# Altium footprint library Apalis Evaluation Board.PcbLib: 212 footprints (part 11 of 14)
Each footprint in its own frame and in the unit in brackets; x right, y up, seen from the top. Pads: shape width x height; smd on the part's side, far side on the other; paste and mask are expansions set on the pad; w line width, h text height; cw(c..) or ccw(c..) is an arc to the next point about the centre after c.
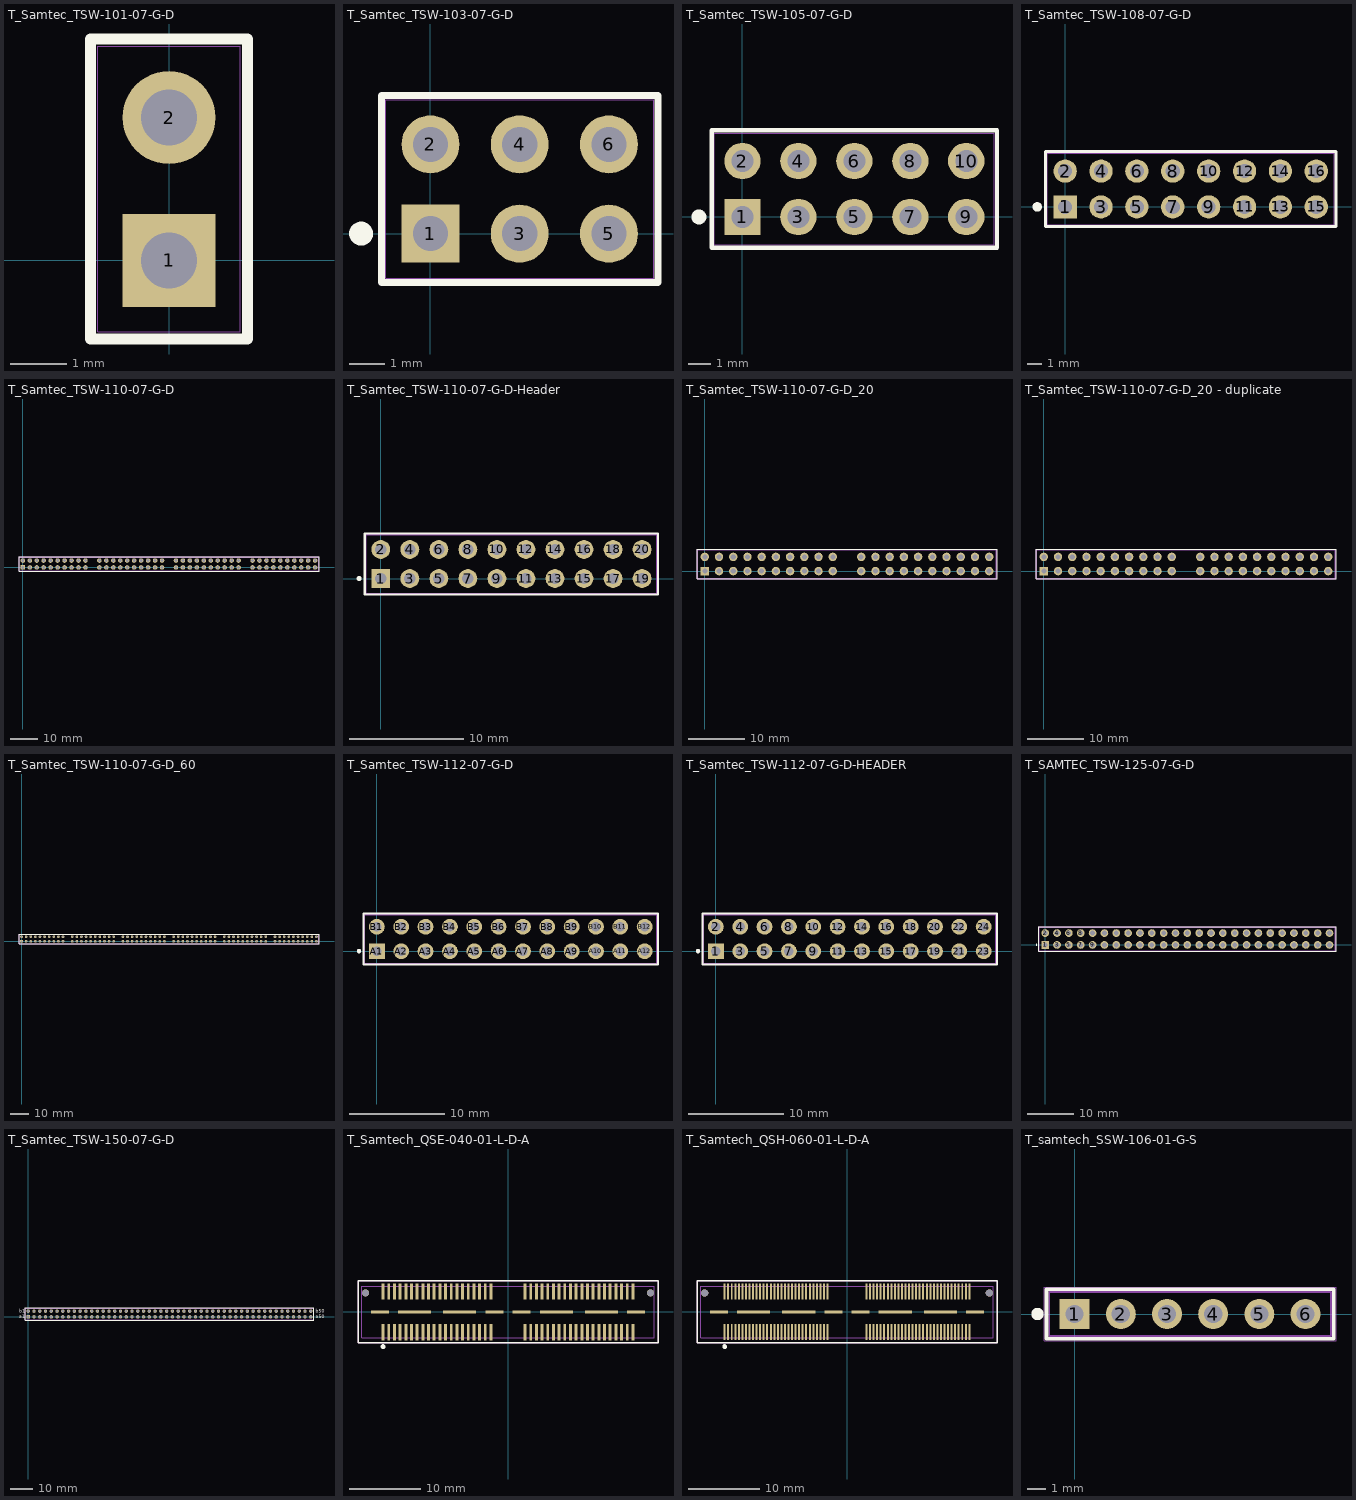
[diagram p10: the footprints below, top view; thin cyan lines are the x and y axes]

## T_Samtec_TSW-101-07-G-D [mm] "Header, 1x2 Pins, 2.54 mm pitch, male"
height 8.51
pads (2):
  rect 1.65x1.65 hole 1: 1(0,0)
  round 1.65 hole 1: 2(0,2.54)
Top Overlay:
  lines w0.2: -1.395,-1.395 -1.395,3.935 1.395,3.935 1.395,-1.395 -1.395,-1.395
Mechanical 1:
  lines w0.05: -1.37,-1.37 1.37,-1.37 1.37,3.91 -1.37,3.91 -1.37,-1.37
Mechanical 2:
  lines w0.001: -1.27,-1.27 -1.27,3.81 1.27,3.81 1.27,-1.27 -1.27,-1.27
Mechanical 3:
  lines w0.1: -1.37,-1.37 1.37,-1.37 1.37,3.91 -1.37,3.91 -1.37,-1.37
3D body "Samtec-TSW-101-07-G-D.step": height 8.4, standoff -2.52, extent -1.27,-1.27 1.27,3.81

## T_Samtec_TSW-103-07-G-D [mm] "Header, 2x3 Pins, 2.54 mm pitch, male"
height 8.51
pads (6):
  rect 1.65x1.65 hole 1: 1(0,0)
  round 1.65 hole 1: 2(0,2.54) 3(2.54,0) 4(2.54,2.54) 5(5.08,0) 6(5.08,2.54)
Top Overlay:
  circle w0.5: c-1.975,0 r0.088
  lines w0.2: -1.395,-1.395 6.475,-1.395 6.475,3.935 -1.395,3.935 -1.395,-1.395
Mechanical 1:
  lines w0.05: -1.37,-1.37 -1.37,3.91 6.45,3.91 6.45,-1.37 -1.37,-1.37
Mechanical 2:
  lines w0.001: -1.27,-1.27 -1.27,3.81 6.35,3.81 6.35,-1.27 -1.27,-1.27
Mechanical 3:
  lines w0.1: -1.37,-1.37 6.45,-1.37 6.45,3.91 -1.37,3.91 -1.37,-1.37
3D body "Samtec-TSW-103-07-G-D.step": height 8.4, standoff -2.52, extent -1.27,-1.27 6.35,3.81

## T_Samtec_TSW-105-07-G-D [mm] "Header, 2x5 Pins, 2.54 mm pitch, male"
height 8.51
pads (10):
  rect 1.65x1.65 hole 1: 1(0,0)
  round 1.65 hole 1: 2(0,2.54) 3(2.54,0) 4(2.54,2.54) 5(5.08,0) 6(5.08,2.54) 7(7.62,0) 8(7.62,2.54) 9(10.16,0) 10(10.16,2.54)
Top Overlay:
  circle w0.5: c-1.975,0 r0.088
  lines w0.2: 11.55,-1.395 -1.395,-1.395 -1.395,3.935 11.55,3.935 ; 11.555,-1.395 11.555,3.935
Mechanical 1:
  lines w0.05: -1.37,-1.37 -1.37,3.91 11.53,3.91 11.53,-1.37 -1.37,-1.37
Mechanical 2:
  lines w0.001: -1.27,-1.27 11.43,-1.27 11.43,3.81 -1.27,3.81 -1.27,-1.27
Mechanical 3:
  lines w0.1: -1.37,-1.37 11.53,-1.37 11.53,3.91 -1.37,3.91 -1.37,-1.37
3D body "Samtec-TSW-105-07-G-D.step": height 8.4, standoff -2.52, extent -1.27,-1.27 11.43,3.81

## T_Samtec_TSW-108-07-G-D [mm] "Header, 2x8 Pins, 2.54 mm pitch, male"
height 8.51
pads (16):
  rect 1.65x1.65 hole 1: 1(0,0)
  round 1.65 hole 1: 2(0,2.54) 3(2.54,0) 4(2.54,2.54) 5(5.08,0) 6(5.08,2.54) 7(7.62,0) 8(7.62,2.54) 9(10.16,0) 10(10.16,2.54) 11(12.7,0) 12(12.7,2.54) 13(15.24,0) 14(15.24,2.54) 15(17.78,0) 16(17.78,2.54)
Top Overlay:
  circle w0.5: c-1.975,0 r0.088
  lines w0.2: -1.395,-1.395 -1.395,3.935 19.175,3.935 19.175,-1.395 -1.395,-1.395
Mechanical 1:
  lines w0.05: -1.37,-1.37 19.15,-1.37 19.15,3.91 -1.37,3.91 -1.37,-1.37
Mechanical 2:
  lines w0.001: -1.27,-1.27 -1.27,3.81 19.05,3.81 19.05,-1.27 -1.27,-1.27
Mechanical 3:
  lines w0.1: -1.37,-1.37 -1.37,3.91 19.15,3.91 19.15,-1.37 -1.37,-1.37
3D body "Samtec-TSW-108-07-G-D.step": height 8.4, standoff -2.52, extent -1.27,-1.27 19.05,3.81

## T_Samtec_TSW-110-07-G-D [mm] "Header 2x50 pin 2.54mm pitch"
height 10.8
pads (80):
  rect 1.65x1.65 hole 1: A1(0,0)
  round 1.65 hole 1: A2(2.54,0) A3(5.08,0) A4(7.62,0) A5(10.16,0) A6(12.7,0) A7(15.24,0) A8(17.78,0) A9(20.32,0) A10(22.86,0) A11(27.94,0) A12(30.48,0) A13(33.02,0) A14(35.56,0) A15(38.1,0) A16(40.64,0) A17(43.18,0) A18(45.72,0) A19(48.26,0) A20(50.8,0) A21(55.88,0) A22(58.42,0) A23(60.96,0) A24(63.5,0) A25(66.04,0) A26(68.58,0) A27(71.12,0) A28(73.66,0) A29(76.2,0) A30(78.74,0) A31(83.82,0) A32(86.36,0) A33(88.9,0) A34(91.44,0) A35(93.98,0) A36(96.52,0) A37(99.06,0) A38(101.6,0) A39(104.14,0) A40(106.68,0) B1(0,2.54) B2(2.54,2.54) B3(5.08,2.54) B4(7.62,2.54) B5(10.16,2.54) B6(12.7,2.54) B7(15.24,2.54) B8(17.78,2.54) B9(20.32,2.54) B10(22.86,2.54) B11(27.94,2.54) B12(30.48,2.54) B13(33.02,2.54) B14(35.56,2.54) B15(38.1,2.54) B16(40.64,2.54) B17(43.18,2.54) B18(45.72,2.54) B19(48.26,2.54) B20(50.8,2.54) B21(55.88,2.54) B22(58.42,2.54) B23(60.96,2.54) B24(63.5,2.54) B25(66.04,2.54) B26(68.58,2.54) B27(71.12,2.54) B28(73.66,2.54) B29(76.2,2.54) B30(78.74,2.54) B31(83.82,2.54) B32(86.36,2.54) B33(88.9,2.54) B34(91.44,2.54) B35(93.98,2.54) B36(96.52,2.54) B37(99.06,2.54) B38(101.6,2.54) B39(104.14,2.54) B40(106.68,2.54)
Top Overlay:
  lines w0.2: -1.395,-1.395 -1.395,3.935 108.075,3.935 108.075,-1.395 -1.395,-1.395
Mechanical 1:
  lines w0.05: -1.37,-1.37 -1.37,3.91 108.05,3.91 108.05,-1.37 -1.37,-1.37
Mechanical 2:
  lines w0.001: 107.95,-1.27 107.95,3.81 ; 107.95,-1.27 107.95,3.81 ; 107.95,-1.27 -1.27,-1.27 -1.27,3.81 107.95,3.81
Mechanical 3:
  lines w0.1: -1.37,-1.37 108.05,-1.37 108.05,3.91 -1.37,3.91 -1.37,-1.37
3D body "Samtec-TSW-110-07-G-D.step": height 8.4, standoff -2.52, extent 82.55,-1.27 107.95,3.81
3D body "Samtec-TSW-110-07-G-D.step": height 8.4, standoff -2.52, extent 54.61,-1.27 80.01,3.81
3D body "Samtec-TSW-110-07-G-D.step": height 8.4, standoff -2.52, extent 26.67,-1.27 52.07,3.81
3D body "Samtec-TSW-110-07-G-D.step": height 8.4, standoff -2.52, extent -1.27,-1.27 24.13,3.81

## T_Samtec_TSW-110-07-G-D-Header [mm] "Header, 2x10 Pins, 2.54 mm pitch"
height 8.51
pads (20):
  rect 1.65x1.65 hole 1: 1(0,0)
  round 1.65 hole 1: 2(0,2.54) 3(2.54,0) 4(2.54,2.54) 5(5.08,0) 6(5.08,2.54) 7(7.62,0) 8(7.62,2.54) 9(10.16,0) 10(10.16,2.54) 11(12.7,0) 12(12.7,2.54) 13(15.24,0) 14(15.24,2.54) 15(17.78,0) 16(17.78,2.54) 17(20.32,0) 18(20.32,2.54) 19(22.86,0) 20(22.86,2.54)
Top Overlay:
  circle w0.25: c-1.896,0 r0.1
  lines w0.2: -1.395,-1.395 -1.395,3.935 24.255,3.935 24.255,-1.349 24.209,-1.395 -1.395,-1.395
Mechanical 1:
  lines w0.05: -1.37,-1.374 24.23,-1.374 24.23,3.916 -1.37,3.916 -1.37,-1.374
Mechanical 2:
  lines w0.001: -1.27,-1.27 24.13,-1.27 24.13,3.81 -1.27,3.81 -1.27,-1.27
Mechanical 3:
  lines w0.1: -1.37,-1.37 24.23,-1.37 24.23,3.91 -1.37,3.91 -1.37,-1.37
3D body "Samtec-TSW-110-07-G-D.step": height 8.4, standoff -2.52, extent -1.27,-1.27 24.13,3.81

## T_Samtec_TSW-110-07-G-D_20 [mm] "Header 2x20 pin 2.54mm pitch"
height 10.8
pads (40):
  rect 1.5x1.5 hole 0.9: A1(0,0)
  round 1.5 hole 0.9: A2(2.54,0) A3(5.08,0) A4(7.62,0) A5(10.16,0) A6(12.7,0) A7(15.24,0) A8(17.78,0) A9(20.32,0) A10(22.86,0) A11(27.94,0) A12(30.48,0) A13(33.02,0) A14(35.56,0) A15(38.1,0) A16(40.64,0) A17(43.18,0) A18(45.72,0) A19(48.26,0) A20(50.8,0) B1(0,2.54) B2(2.54,2.54) B3(5.08,2.54) B4(7.62,2.54) B5(10.16,2.54) B6(12.7,2.54) B7(15.24,2.54) B8(17.78,2.54) B9(20.32,2.54) B10(22.86,2.54) B11(27.94,2.54) B12(30.48,2.54) B13(33.02,2.54) B14(35.56,2.54) B15(38.1,2.54) B16(40.64,2.54) B17(43.18,2.54) B18(45.72,2.54) B19(48.26,2.54) B20(50.8,2.54)
Top Overlay:
  lines w0.2: -1.395,-1.395 -1.395,3.935 52.195,3.935 52.195,-1.395 -1.395,-1.395
Mechanical 1:
  lines w0.05: -1.37,-1.37 -1.37,3.91 52.17,3.91 52.17,-1.37 -1.37,-1.37
Mechanical 2:
  lines w0.001: 52.07,-1.27 -1.27,-1.27 -1.27,3.81 52.07,3.81 ; 52.07,-1.27 52.07,3.81 ; 52.07,-1.27 52.07,3.81
Mechanical 3:
  lines w0.1: -1.37,-1.37 52.17,-1.37 52.17,3.91 -1.37,3.91 -1.37,-1.37
3D body "Samtec-TSW-110-07-G-D.step": height 8.4, standoff -2.52, extent 26.67,-1.27 52.07,3.81
3D body "Samtec-TSW-110-07-G-D.step": height 8.4, standoff -2.52, extent -1.27,-1.27 24.13,3.81

## T_Samtec_TSW-110-07-G-D_20 - duplicate [mm] "Header 2x20 pin 2.54mm pitch"
height 10.8
pads (40):
  rect 1.5x1.5 hole 0.9: A1(0,0)
  round 1.5 hole 0.9: A2(2.54,0) A3(5.08,0) A4(7.62,0) A5(10.16,0) A6(12.7,0) A7(15.24,0) A8(17.78,0) A9(20.32,0) A10(22.86,0) A11(27.94,0) A12(30.48,0) A13(33.02,0) A14(35.56,0) A15(38.1,0) A16(40.64,0) A17(43.18,0) A18(45.72,0) A19(48.26,0) A20(50.8,0) B1(0,2.54) B2(2.54,2.54) B3(5.08,2.54) B4(7.62,2.54) B5(10.16,2.54) B6(12.7,2.54) B7(15.24,2.54) B8(17.78,2.54) B9(20.32,2.54) B10(22.86,2.54) B11(27.94,2.54) B12(30.48,2.54) B13(33.02,2.54) B14(35.56,2.54) B15(38.1,2.54) B16(40.64,2.54) B17(43.18,2.54) B18(45.72,2.54) B19(48.26,2.54) B20(50.8,2.54)
Top Overlay:
  lines w0.2: -1.395,-1.395 52.195,-1.395 52.195,3.935 -1.395,3.935 -1.395,-1.395
Mechanical 1:
  lines w0.05: -1.37,-1.37 52.17,-1.37 52.17,3.91 -1.37,3.91 -1.37,-1.37
Mechanical 2:
  lines w0.001: 52.07,-1.27 52.07,3.81 ; 52.07,-1.27 52.07,3.81 ; 52.07,-1.27 -1.27,-1.27 -1.27,3.81 52.07,3.81
Mechanical 3:
  lines w0.1: -1.37,-1.37 -1.37,3.91 52.17,3.91 52.17,-1.37 -1.37,-1.37
3D body "Samtec-TSW-110-07-G-D.step": height 8.4, standoff -2.52, extent -1.27,-1.27 24.13,3.81
3D body "Samtec-TSW-110-07-G-D.step": height 8.4, standoff -2.52, extent 26.67,-1.27 52.07,3.81

## T_Samtec_TSW-110-07-G-D_60 [mm] "Header 2x60 pin 2.54mm pitch"
height 10.8
pads (120):
  rect 1.5x1.5 hole 0.9: A1(0,0)
  round 1.5 hole 0.9: A2(2.54,0) A3(5.08,0) A4(7.62,0) A5(10.16,0) A6(12.7,0) A7(15.24,0) A8(17.78,0) A9(20.32,0) A10(22.86,0) A11(27.94,0) A12(30.48,0) A13(33.02,0) A14(35.56,0) A15(38.1,0) A16(40.64,0) A17(43.18,0) A18(45.72,0) A19(48.26,0) A20(50.8,0) A21(55.88,0) A22(58.42,0) A23(60.96,0) A24(63.5,0) A25(66.04,0) A26(68.58,0) A27(71.12,0) A28(73.66,0) A29(76.2,0) A30(78.74,0) A31(83.82,0) A32(86.36,0) A33(88.9,0) A34(91.44,0) A35(93.98,0) A36(96.52,0) A37(99.06,0) A38(101.6,0) A39(104.14,0) A40(106.68,0) A41(111.76,0) A42(114.3,0) A43(116.84,0) A44(119.38,0) A45(121.92,0) A46(124.46,0) A47(127,0) A48(129.54,0) A49(132.08,0) A50(134.62,0) A51(139.7,0) A52(142.24,0) A53(144.78,0) A54(147.32,0) A55(149.86,0) A56(152.4,0) A57(154.94,0) A58(157.48,0) A59(160.02,0) A60(162.56,0) B1(0,2.54) B2(2.54,2.54) B3(5.08,2.54) B4(7.62,2.54) B5(10.16,2.54) B6(12.7,2.54) B7(15.24,2.54) B8(17.78,2.54) B9(20.32,2.54) B10(22.86,2.54) B11(27.94,2.54) B12(30.48,2.54) B13(33.02,2.54) B14(35.56,2.54) B15(38.1,2.54) B16(40.64,2.54) B17(43.18,2.54) B18(45.72,2.54) B19(48.26,2.54) B20(50.8,2.54) B21(55.88,2.54) B22(58.42,2.54) B23(60.96,2.54) B24(63.5,2.54) B25(66.04,2.54) B26(68.58,2.54) B27(71.12,2.54) B28(73.66,2.54) B29(76.2,2.54) B30(78.74,2.54) B31(83.82,2.54) B32(86.36,2.54) B33(88.9,2.54) B34(91.44,2.54) B35(93.98,2.54) B36(96.52,2.54) B37(99.06,2.54) B38(101.6,2.54) B39(104.14,2.54) B40(106.68,2.54) B41(111.76,2.54) B42(114.3,2.54) B43(116.84,2.54) B44(119.38,2.54) B45(121.92,2.54) B46(124.46,2.54) B47(127,2.54) B48(129.54,2.54) B49(132.08,2.54) B50(134.62,2.54) B51(139.7,2.54) B52(142.24,2.54) B53(144.78,2.54) B54(147.32,2.54) B55(149.86,2.54) B56(152.4,2.54) B57(154.94,2.54) B58(157.48,2.54) B59(160.02,2.54) B60(162.56,2.54)
Top Overlay:
  lines w0.2: -1.395,-1.395 163.955,-1.395 163.955,3.935 -1.395,3.935 -1.395,-1.395
Mechanical 1:
  lines w0.05: -1.37,-1.37 163.93,-1.37 163.93,3.91 -1.37,3.91 -1.37,-1.37
Mechanical 2:
  lines w0.001: 163.83,-1.27 -1.27,-1.27 -1.27,3.81 163.83,3.81 ; 163.83,-1.27 163.83,3.81 ; 163.83,-1.27 163.83,3.81
Mechanical 3:
  lines w0.1: -1.37,-1.37 163.93,-1.37 163.93,3.91 -1.37,3.91 -1.37,-1.37
3D body "Samtec-TSW-110-07-G-D.step": height 8.4, standoff -2.52, extent -1.27,-1.27 24.13,3.81
3D body "Samtec-TSW-110-07-G-D.step": height 8.4, standoff -2.52, extent 26.67,-1.27 52.07,3.81
3D body "Samtec-TSW-110-07-G-D.step": height 8.4, standoff -2.52, extent 54.61,-1.27 80.01,3.81
3D body "Samtec-TSW-110-07-G-D.step": height 8.4, standoff -2.52, extent 82.55,-1.27 107.95,3.81
3D body "Samtec-TSW-110-07-G-D.step": height 8.4, standoff -2.52, extent 110.49,-1.27 135.89,3.81
3D body "Samtec-TSW-110-07-G-D.step": height 8.4, standoff -2.52, extent 138.43,-1.27 163.83,3.81

## T_Samtec_TSW-112-07-G-D [mm] "Header, 2x12 Pins, 2.54 mm pitch, male"
height 8.51
pads (24):
  rect 1.65x1.65 hole 1: A1(0,0)
  round 1.65 hole 1: A2(2.54,0) A3(5.08,0) A4(7.62,0) A5(10.16,0) A6(12.7,0) A7(15.24,0) A8(17.78,0) A9(20.32,0) A10(22.86,0) A11(25.4,0) A12(27.94,0) B1(0,2.54) B2(2.54,2.54) B3(5.08,2.54) B4(7.62,2.54) B5(10.16,2.54) B6(12.7,2.54) B7(15.24,2.54) B8(17.78,2.54) B9(20.32,2.54) B10(22.86,2.54) B11(25.4,2.54) B12(27.94,2.54)
Top Overlay:
  circle w0.25: c-1.871,0 r0.1
  lines w0.2: -1.395,-1.395 -1.395,3.935 29.335,3.935 29.335,-1.395 -1.395,-1.395
Mechanical 1:
  lines w0.05: -1.37,-1.373 -1.37,3.91 29.31,3.91 29.31,-1.373 -1.37,-1.373
Mechanical 2:
  lines w0.001: -1.27,-1.27 -1.27,3.81 29.21,3.81 29.21,-1.27 -1.27,-1.27
Mechanical 3:
  lines w0.1: -1.37,-1.37 -1.37,3.91 29.31,3.91 29.31,-1.37 -1.37,-1.37
3D body "Samtec-TSW-112-07-G-D.step": height 8.4, standoff -2.52, extent -1.27,-1.27 29.21,3.81

## T_Samtec_TSW-112-07-G-D-HEADER [mm] "Header, 2x12 Pins, 2.54 mm pitch, male"
height 8.51
pads (24):
  rect 1.65x1.65 hole 1: 1(0,0)
  round 1.65 hole 1: 2(0,2.54) 3(2.54,0) 4(2.54,2.54) 5(5.08,0) 6(5.08,2.54) 7(7.62,0) 8(7.62,2.54) 9(10.16,0) 10(10.16,2.54) 11(12.7,0) 12(12.7,2.54) 13(15.24,0) 14(15.24,2.54) 15(17.78,0) 16(17.78,2.54) 17(20.32,0) 18(20.32,2.54) 19(22.86,0) 20(22.86,2.54) 21(25.4,0) 22(25.4,2.54) 23(27.94,0) 24(27.94,2.54)
Top Overlay:
  circle w0.25: c-1.871,0 r0.1
  lines w0.2: -1.395,-1.395 -1.395,3.935 29.335,3.935 29.335,-1.395 -1.395,-1.395
Mechanical 1:
  lines w0.05: -1.37,-1.373 -1.37,3.91 29.31,3.91 29.31,-1.373 -1.37,-1.373
Mechanical 2:
  lines w0.001: -1.27,-1.27 -1.27,3.81 29.21,3.81 29.21,-1.27 -1.27,-1.27
Mechanical 3:
  lines w0.1: -1.37,-1.37 -1.37,3.91 29.31,3.91 29.31,-1.37 -1.37,-1.37
3D body "Samtec-TSW-112-07-G-D.step": height 8.4, standoff -2.52, extent -1.27,-1.27 29.21,3.81

## T_SAMTEC_TSW-125-07-G-D [mm] "Header, 2x25 Pins, 2.54 mm pitch"
height 8.51
pads (50):
  rect 1.65x1.65 hole 1.016: 1(0,0)
  round 1.65 hole 1.016: 2(0,2.54)
  round 1.65 hole 1: 3(2.54,0) 4(2.54,2.54) 5(5.08,0) 6(5.08,2.54) 7(7.62,0) 8(7.62,2.54) 9(10.16,0) 10(10.16,2.54) 11(12.7,0) 12(12.7,2.54) 13(15.24,0) 14(15.24,2.54) 15(17.78,0) 16(17.78,2.54) 17(20.32,0) 18(20.32,2.54) 19(22.86,0) 20(22.86,2.54) 21(25.4,0) 22(25.4,2.54) 23(27.94,0) 24(27.94,2.54) 25(30.48,0) 26(30.48,2.54) 27(33.02,0) 28(33.02,2.54) 29(35.56,0) 30(35.56,2.54) 31(38.1,0) 32(38.1,2.54) 33(40.64,0) 34(40.64,2.54) 35(43.18,0) 36(43.18,2.54) 37(45.72,0) 38(45.72,2.54) 39(48.26,0) 40(48.26,2.54) 41(50.8,0) 42(50.8,2.54) 43(53.34,0) 44(53.34,2.54) 45(55.88,0) 46(55.88,2.54) 47(58.42,0) 48(58.42,2.54) 49(60.96,0) 50(60.96,2.54)
Top Overlay:
  circle w0.25: c-1.871,0 r0.1
  lines w0.2: -1.395,-1.395 -1.395,3.935 62.355,3.935 62.355,-1.395 -1.395,-1.395
Mechanical 1:
  circle w0.05: c0,0 r0.35
  lines w0.05: -0.5,0 0.5,0 ; 0,-0.5 0,0.5 ; -1.37,-1.369 62.33,-1.369 62.33,3.91 -1.37,3.91 -1.37,-1.369
Mechanical 2:
  lines w0.001: -1.27,-1.27 -1.27,3.81 62.23,3.81 62.23,-1.27 -1.27,-1.27
Mechanical 3:
  lines w0.1: -1.37,-1.369 -1.37,3.91 62.33,3.91 62.33,-1.369 -1.37,-1.369
3D body "Samtec-TSW-125-07-G-D.step": height 8.38, standoff -2.54, extent -1.27,-1.27 62.23,3.81

## T_Samtec_TSW-150-07-G-D [mm] "Header 2x50 pin 2.54mm pitch"
height 10.8
pads (100):
  rect 1.5x1.5 hole 1: 1(0,0)
  round 1.5 hole 1: 2(0,2.54) 3(2.54,0) 4(2.54,2.54) 5(5.08,0) 6(5.08,2.54) 7(7.62,0) 8(7.62,2.54) 9(10.16,0) 10(10.16,2.54) 11(12.7,0) 12(12.7,2.54) 13(15.24,0) 14(15.24,2.54) 15(17.78,0) 16(17.78,2.54) 17(20.32,0) 18(20.32,2.54) 19(22.86,0) 20(22.86,2.54) 21(25.4,0) 22(25.4,2.54) 23(27.94,0) 24(27.94,2.54) 25(30.48,0) 26(30.48,2.54) 27(33.02,0) 28(33.02,2.54) 29(35.56,0) 30(35.56,2.54) 31(38.1,0) 32(38.1,2.54) 33(40.64,0) 34(40.64,2.54) 35(43.18,0) 36(43.18,2.54) 37(45.72,0) 38(45.72,2.54) 39(48.26,0) 40(48.26,2.54) 41(50.8,0) 42(50.8,2.54) 43(53.34,0) 44(53.34,2.54) 45(55.88,0) 46(55.88,2.54) 47(58.42,0) 48(58.42,2.54) 49(60.96,0) 50(60.96,2.54) 51(63.5,0) 52(63.5,2.54) 53(66.04,0) 54(66.04,2.54) 55(68.58,0) 56(68.58,2.54) 57(71.12,0) 58(71.12,2.54) 59(73.66,0) 60(73.66,2.54) 61(76.2,0) 62(76.2,2.54) 63(78.74,0) 64(78.74,2.54) 65(81.28,0) 66(81.28,2.54) 67(83.82,0) 68(83.82,2.54) 69(86.36,0) 70(86.36,2.54) 71(88.9,0) 72(88.9,2.54) 73(91.44,0) 74(91.44,2.54) 75(93.98,0) 76(93.98,2.54) 77(96.52,0) 78(96.52,2.54) 79(99.06,0) 80(99.06,2.54) 81(101.6,0) 82(101.6,2.54) 83(104.14,0) 84(104.14,2.54) 85(106.68,0) 86(106.68,2.54) 87(109.22,0) 88(109.22,2.54) 89(111.76,0) 90(111.76,2.54) 91(114.3,0) 92(114.3,2.54) 93(116.84,0) 94(116.84,2.54) 95(119.38,0) 96(119.38,2.54) 97(121.92,0) 98(121.92,2.54) 99(124.46,0) 100(124.46,2.54)
Top Overlay:
  lines w0.2: -1.395,-1.395 125.855,-1.395 125.855,3.935 -1.395,3.935 -1.395,-1.395
  text "a50" at 126.55,-0.65 h1.52
  text "b50" at 126.55,1.85 h1.52
  text "b1" at -4.07,1.82 h1.52
  text "a1" at -4.069,-0.7 h1.52
Mechanical 1:
  lines w0.05: -1.37,-1.37 125.83,-1.37 125.83,3.91 -1.37,3.91 -1.37,-1.37
Mechanical 2:
  lines w0.001: -1.27,-1.27 125.73,-1.27 125.73,3.81 -1.27,3.81 -1.27,-1.27
Mechanical 3:
  lines w0.1: -1.37,-1.37 -1.37,3.91 125.83,3.91 125.83,-1.37 -1.37,-1.37
3D body "Samtec-TSW-150-07-G-D.step": height 8.4, standoff -2.52, extent -1.27,-1.27 125.73,3.81

## T_Samtech_QSE-040-01-L-D-A [mm] "High Speed Ground Plane Socket"
height 3.25
pads (90):
  round 1 hole 1.02 unplated: 0(-20.065,2.67) ""(20.065,2.67)
  rect 0.41x2.27 smd mask+0.05: 1(-17.6,-2.87) 2(-17.6,2.87) 3(-16.8,-2.87) 4(-16.8,2.87) 5(-16,-2.87) 6(-16,2.87) 7(-15.2,-2.87) 8(-15.2,2.87) 9(-14.4,-2.87) 10(-14.4,2.87) 11(-13.6,-2.87) 12(-13.6,2.87) 13(-12.8,-2.87) 14(-12.8,2.87) 15(-12,-2.87) 16(-12,2.87) 17(-11.2,-2.87) 18(-11.2,2.87) 19(-10.4,-2.87) 20(-10.4,2.87) 21(-9.6,-2.87) 22(-9.6,2.87) 23(-8.8,-2.87) 24(-8.8,2.87) 25(-8,-2.87) 26(-8,2.87) 27(-7.2,-2.87) 28(-7.2,2.87) 29(-6.4,-2.87) 30(-6.4,2.87) 31(-5.6,-2.87) 32(-5.6,2.87) 33(-4.8,-2.87) 34(-4.8,2.87) 35(-4,-2.87) 36(-4,2.87) 37(-3.2,-2.87) 38(-3.2,2.87) 39(-2.4,-2.87) 40(-2.4,2.87) 41(2.4,-2.87) 42(2.4,2.87) 43(3.2,-2.87) 44(3.2,2.87) 45(4,-2.87) 46(4,2.87) 47(4.8,-2.87) 48(4.8,2.87) 49(5.6,-2.87) 50(5.6,2.87) 51(6.4,-2.87) 52(6.4,2.87) 53(7.2,-2.87) 54(7.2,2.87) 55(8,-2.87) 56(8,2.87) 57(8.8,-2.87) 58(8.8,2.87) 59(9.6,-2.87) 60(9.6,2.87) 61(10.4,-2.87) 62(10.4,2.87) 63(11.2,-2.87) 64(11.2,2.87) 65(12,-2.87) 66(12,2.87) 67(12.8,-2.87) 68(12.8,2.87) 69(13.6,-2.87) 70(13.6,2.87) 71(14.4,-2.87) 72(14.4,2.87) 73(15.2,-2.87) 74(15.2,2.87) 75(16,-2.87) 76(16,2.87) 77(16.8,-2.87) 78(16.8,2.87) 79(17.6,-2.87) 80(17.6,2.87)
  rect 2.54x0.43 smd mask+0.05: 81(-18.065,0) 81(-1.935,0) 81(1.935,0) 81(18.065,0)
  rect 4.7x0.43 smd mask+0.05: 81(-13.175,0) 81(-6.825,0) 81(6.825,0) 81(13.175,0)
Top Overlay:
  circle w0.5: c-17.6,-4.9 r0.088
  lines w0.2: -21.135,-4.38 21.135,-4.38 21.135,4.38 -21.135,4.38 -21.135,-4.38
Mechanical 1:
  lines w0.05: -21.135,-4.38 21.135,-4.38 21.135,4.38 -21.135,4.38 -21.135,-4.38
Mechanical 2:
  lines w0.01: -20.635,-3.62 20.635,-3.62 20.635,3.62 -20.635,3.62 -20.635,-3.62
Mechanical 3:
  lines w0.1: -20.635,-3.62 20.635,-3.62 20.635,3.62 -20.635,3.62 -20.635,-3.62
3D body "QSE-040-01-X-D-A.STEP": height 3.06, standoff -0.49, extent -20.635,-3.747 20.64,3.746

## T_Samtech_QSH-060-01-L-D-A [mm] "High Speed Ground Plane Socket"
height 3.25
pads (130):
  rect 0.28x2.27 smd: 1(-17.25,-2.865) 2(-17.25,2.865) 3(-16.75,-2.865) 4(-16.75,2.865) 5(-16.25,-2.865) 6(-16.25,2.865) 7(-15.75,-2.865) 8(-15.75,2.865) 9(-15.25,-2.865) 10(-15.25,2.865) 11(-14.75,-2.865) 12(-14.75,2.865) 13(-14.25,-2.865) 14(-14.25,2.865) 15(-13.75,-2.865) 16(-13.75,2.865) 17(-13.25,-2.865) 18(-13.25,2.865) 19(-12.75,-2.865) 20(-12.75,2.865) 21(-12.25,-2.865) 22(-12.25,2.865) 23(-11.75,-2.865) 24(-11.75,2.865) 25(-11.25,-2.865) 26(-11.25,2.865) 27(-10.75,-2.865) 28(-10.75,2.865) 29(-10.25,-2.865) 30(-10.25,2.865) 31(-9.75,-2.865) 32(-9.75,2.865) 33(-9.25,-2.865) 34(-9.25,2.865) 35(-8.75,-2.865) 36(-8.75,2.865) 37(-8.25,-2.865) 38(-8.25,2.865) 39(-7.75,-2.865) 40(-7.75,2.865) 41(-7.25,-2.865) 42(-7.25,2.865) 43(-6.75,-2.865) 44(-6.75,2.865) 45(-6.25,-2.865) 46(-6.25,2.865) 47(-5.75,-2.865) 48(-5.75,2.865) 49(-5.25,-2.865) 50(-5.25,2.865) 51(-4.75,-2.865) 52(-4.75,2.865) 53(-4.25,-2.865) 54(-4.25,2.865) 55(-3.75,-2.865) 56(-3.75,2.865) 57(-3.25,-2.865) 58(-3.25,2.865) 59(-2.75,-2.865) 60(-2.75,2.865) 61(2.75,-2.865) 62(2.75,2.865) 63(3.25,-2.865) 64(3.25,2.865) 65(3.75,-2.865) 66(3.75,2.865) 67(4.25,-2.865) 68(4.25,2.865) 69(4.75,-2.865) 70(4.75,2.865) 71(5.25,-2.865) 72(5.25,2.865) 73(5.75,-2.865) 74(5.75,2.865) 75(6.25,-2.865) 76(6.25,2.865) 77(6.75,-2.865) 78(6.75,2.865) 79(7.25,-2.865) 80(7.25,2.865) 81(7.75,-2.865) 82(7.75,2.865) 83(8.25,-2.865) 84(8.25,2.865) 85(8.75,-2.865) 86(8.75,2.865) 87(9.25,-2.865) 88(9.25,2.865) 89(9.75,-2.865) 90(9.75,2.865) 91(10.25,-2.865) 92(10.25,2.865) 93(10.75,-2.865) 94(10.75,2.865) 95(11.25,-2.865) 96(11.25,2.865) 97(11.75,-2.865) 98(11.75,2.865) 99(12.25,-2.865) 100(12.25,2.865) 101(12.75,-2.865) 102(12.75,2.865) 103(13.25,-2.865) 104(13.25,2.865) 105(13.75,-2.865) 106(13.75,2.865) 107(14.25,-2.865) 108(14.25,2.865) 109(14.75,-2.865) 110(14.75,2.865) 111(15.25,-2.865) 112(15.25,2.865) 113(15.75,-2.865) 114(15.75,2.865) 115(16.25,-2.865) 116(16.25,2.865) 117(16.75,-2.865) 118(16.75,2.865) 119(17.25,-2.865) 120(17.25,2.865)
  rect 2.54x0.43 smd: 121(-18.065,0) 121(-1.935,0) 121(1.935,0) 121(18.065,0)
  rect 4.7x0.43 smd: 121(-13.175,0) 121(-6.825,0) 121(6.825,0) 121(13.175,0)
  round 1.02 hole 1.02 unplated: ""(-20.065,2.67) ""(20.065,2.67)
Top Overlay:
  circle w0.5: c-17.25,-4.895 r0.088
  lines w0.2: -21.15,-4.38 -21.15,4.38 21.15,4.38 21.15,-4.38 -21.15,-4.38
Mechanical 1:
  lines w0.05: -21.15,-4.38 21.15,-4.38 21.15,4.38 -21.15,4.38 -21.15,-4.38
Mechanical 2:
  lines w0.01: -20.65,-3.62 -20.65,3.62 20.65,3.62 20.65,-3.62 -20.65,-3.62
Mechanical 3:
  lines w0.1: -20.65,-3.62 20.65,-3.62 20.65,3.62 -20.65,3.62 -20.65,-3.62
3D body "QSH-060-01-X-D-A-K.STEP": height 3.27, standoff -0.29, extent -20.637,-3.746 20.638,3.747

## T_samtech_SSW-106-01-G-S [mm] "Receptacle Female Socket, 1x6 Pins, 2.54mm pitch"
height 8.51
pads (6):
  rect 1.65x1.65 hole 1: 1(0,0)
  round 1.65 hole 1: 2(2.54,0) 3(5.08,0) 4(7.62,0) 5(10.16,0) 6(12.7,0)
Top Overlay:
  circle w0.5: c-2.038,0 r0.088
  lines w0.2: -1.55,-1.355 14.25,-1.355 14.25,1.355 -1.55,1.355 -1.55,-1.355
Mechanical 1:
  lines w0.05: -1.675,-1.48 14.375,-1.48 14.375,1.48 -1.675,1.48 -1.675,-1.48
Mechanical 2:
  lines w0.01: -1.4,-1.205 -1.4,1.205 14.1,1.205 14.1,-1.205 -1.4,-1.205
Mechanical 3:
  lines w0.1: -1.4,-1.205 -1.4,1.205 14.1,1.205 14.1,-1.205 -1.4,-1.205
3D body "Samtec-SSW-106-01-G-S.step": height 8.52, standoff -2.63, extent -1.524,-1.206 14.224,1.207